# Altium footprint library FxPcbLib.PcbLib: 112 footprints (part 3 of 7)
Each footprint in its own frame and in the unit in brackets; x right, y up, seen from the top. Pads: shape width x height; smd on the part's side, far side on the other; paste and mask are expansions set on the pad; w line width, h text height; cw(c..) or ccw(c..) is an arc to the next point about the centre after c.
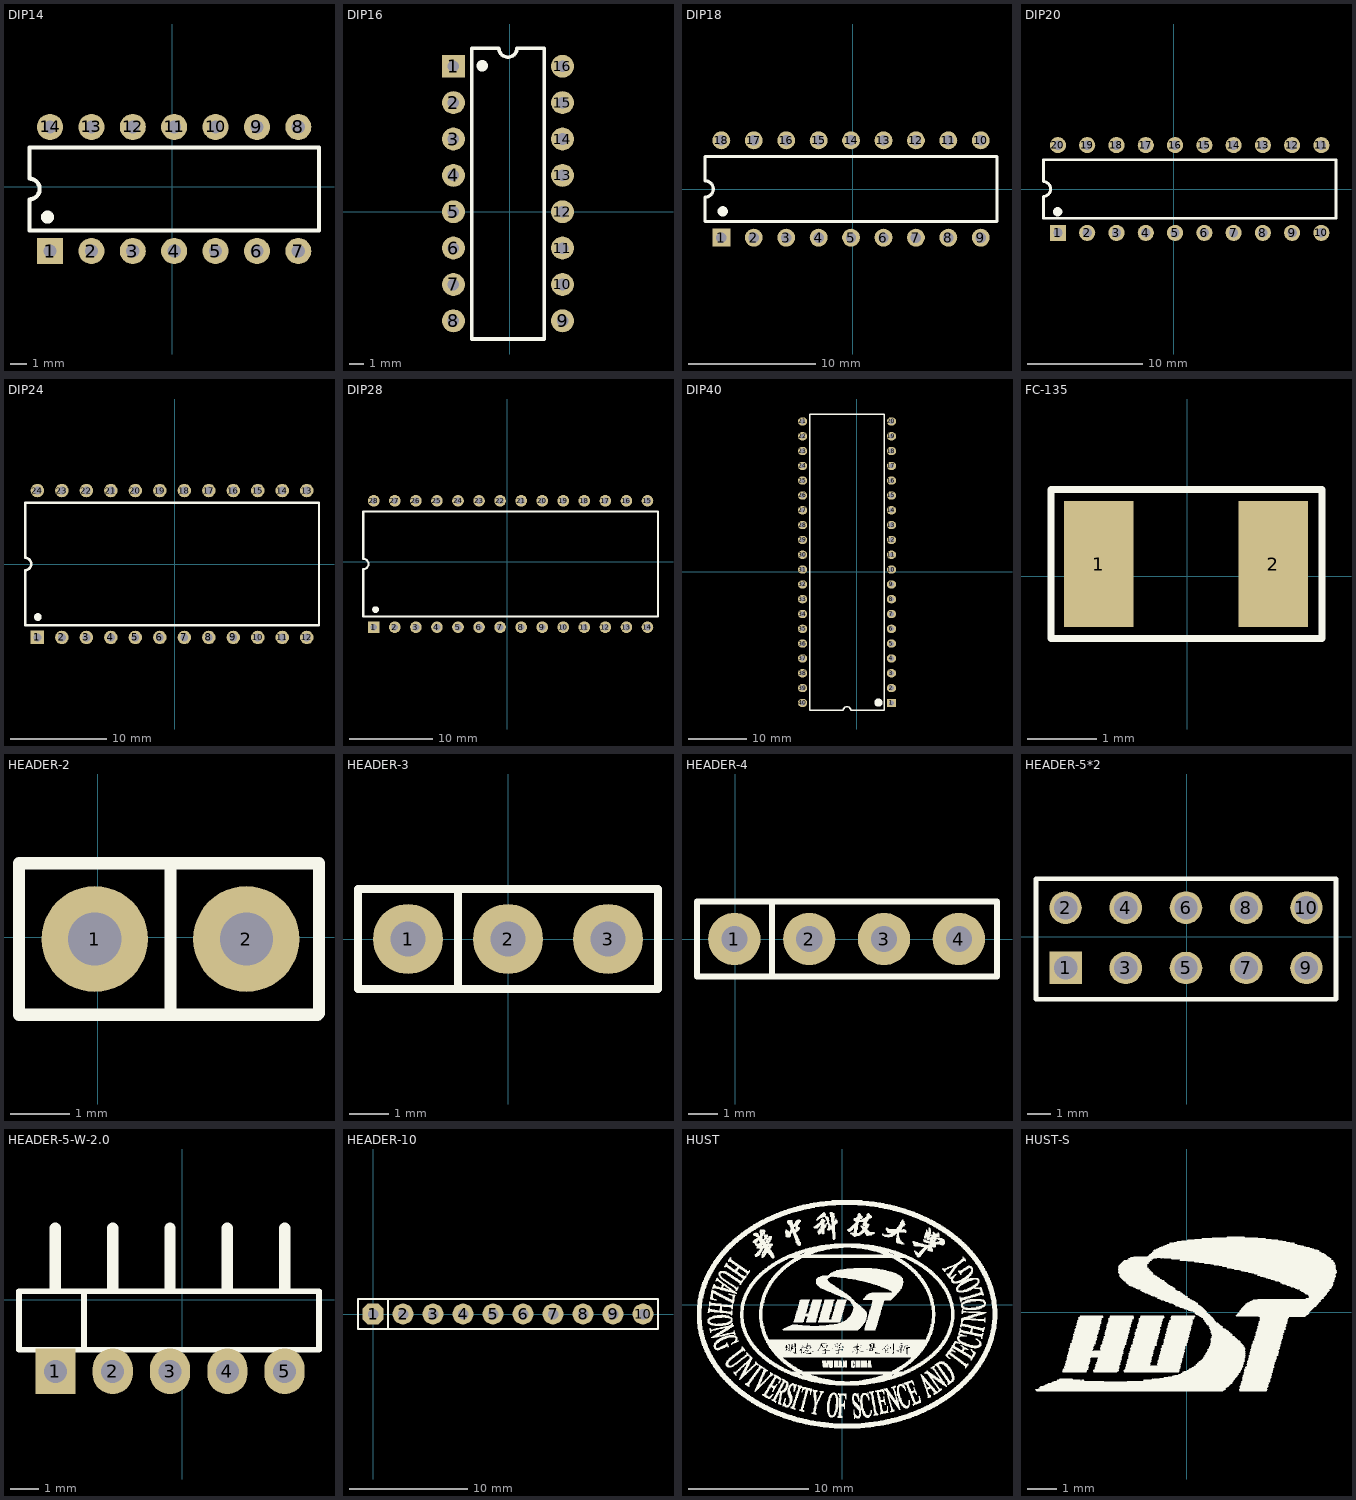
[diagram p2: the footprints below, top view; thin cyan lines are the x and y axes]

## DIP14 [mil]
pads (14):
  rect 62.99x62.99 hole 32: 1(-295,-155)
  round 62.99 hole 32: 2(-195,-155) 3(-95,-155) 4(5,-155) 5(105,-155) 6(205,-155) 7(305,-155) 8(305,145) 9(205,145) 10(105,145) 11(5,145) 12(-95,145) 13(-195,145) 14(-295,145)
Top Overlay:
  circle w19.68: c-301.1,-72.91 r5.91
  lines w10: -345,-105 -345,-30 ccw(c-345,-5) -345,20 -345,95 355,95 355,-105 -345,-105
3D body: height 200.79, standoff -129.92, extent -388.7,-164.84 398.7,145

## DIP16 [mm]
pads (16):
  rect 1.6x1.6 hole 0.813: 1(-3.941,10.16)
  round 1.6 hole 0.813: 2(-3.941,7.62) 3(-3.941,5.08) 4(-3.941,2.54) 5(-3.941,0) 6(-3.941,-2.54) 7(-3.941,-5.08) 8(-3.941,-7.62) 9(3.687,-7.62) 10(3.679,-5.08) 11(3.679,-2.54) 12(3.679,0) 13(3.679,2.54) 14(3.679,5.08) 15(3.679,7.62) 16(3.679,10.16)
Top Overlay:
  circle w0.5: c-1.927,10.195 r0.15
  lines w0.254: -2.671,-8.89 2.409,-8.89 2.409,11.43 0.504,11.43 cw(c-0.131,11.43) -0.766,11.43 -2.671,11.43 -2.671,-8.89
3D body: height 5.1, standoff -3.3, extent -4.06,-8.603 3.81,11.397

## DIP18 [mm]
pads (18):
  rect 1.4x1.4 hole 0.813: 1(-10.287,-3.81)
  round 1.4 hole 0.813: 2(-7.747,-3.81) 3(-5.207,-3.81) 4(-2.667,-3.81) 5(-0.127,-3.81) 6(2.413,-3.81) 7(4.953,-3.81) 8(7.493,-3.81) 9(10.033,-3.81) 10(10.033,3.81) 11(7.493,3.81) 12(4.953,3.81) 13(2.413,3.81) 14(-0.127,3.81) 15(-2.667,3.81) 16(-5.207,3.81) 17(-7.747,3.81) 18(-10.287,3.81)
Top Overlay:
  circle w0.5: c-10.177,-1.75 r0.15
  lines w0.254: -11.557,-2.54 -11.557,-0.635 ccw(c-11.557,0) -11.557,0.635 -11.557,2.54 11.303,2.54 11.303,-2.54 -11.557,-2.54
3D body: height 5.5, standoff -2.5, extent -11.557,-3.937 11.303,3.81

## DIP20 [mm]
pads (20):
  rect 1.4x1.4 hole 0.813: 1(-10.033,-3.81)
  round 1.4 hole 0.813: 2(-7.493,-3.81) 3(-4.953,-3.81) 4(-2.413,-3.81) 5(0.127,-3.81) 6(2.667,-3.81) 7(5.207,-3.81) 8(7.747,-3.81) 9(10.287,-3.81) 10(12.827,-3.81) 11(12.827,3.81) 12(10.287,3.81) 13(7.747,3.81) 14(5.207,3.81) 15(2.667,3.81) 16(0.127,3.81) 17(-2.413,3.81) 18(-4.953,3.81) 19(-7.493,3.81) 20(-10.033,3.81)
Top Overlay:
  circle w0.5: c-10.053,-1.975 r0.15
  lines w0.254: -11.303,-2.54 14.097,-2.54 14.097,2.54 -11.303,2.54 -11.303,0.635 cw(c-11.303,0) -11.303,-0.635 -11.303,-2.54
3D body: height 4.5, standoff -3.5, extent -11.494,-4.05 14.106,3.711

## DIP24 [mm]
pads (24):
  rect 1.4x1.4 hole 0.813: 1(-14.224,-7.62)
  round 1.4 hole 0.813: 2(-11.684,-7.62) 3(-9.144,-7.62) 4(-6.604,-7.62) 5(-4.064,-7.62) 6(-1.524,-7.62) 7(1.016,-7.62) 8(3.556,-7.62) 9(6.096,-7.62) 10(8.636,-7.62) 11(11.176,-7.62) 12(13.716,-7.62) 13(13.716,7.62) 14(11.176,7.62) 15(8.636,7.62) 16(6.096,7.62) 17(3.556,7.62) 18(1.016,7.62) 19(-1.524,7.62) 20(-4.064,7.62) 21(-6.604,7.62) 22(-9.144,7.62) 23(-11.684,7.62) 24(-14.224,7.62)
Top Overlay:
  circle w0.5: c-14.179,-5.5 r0.15
  lines w0.254: -15.494,-6.35 -15.494,-0.635 ccw(c-15.494,0) -15.494,0.635 -15.494,6.35 14.986,6.35 14.986,-6.35 -15.494,-6.35
3D body: height 5.79, standoff -3.3, extent -16.51,-7.491 16.13,7.745

## DIP28 [mil]
pads (28):
  rect 55.12x55.12 hole 32: 1(-635,-310)
  round 55.12 hole 32: 2(-535,-310) 3(-435,-310) 4(-335,-310) 5(-235,-310) 6(-135,-310) 7(-35,-310) 8(65,-310) 9(165,-310) 10(265,-310) 11(365,-310) 12(465,-310) 13(565,-310) 14(665,-310) 15(665,290) 16(565,290) 17(465,290) 18(365,290) 19(265,290) 20(165,290) 21(65,290) 22(-35,290) 23(-135,290) 24(-235,290) 25(-335,290) 26(-435,290) 27(-535,290) 28(-635,290)
Top Overlay:
  circle w19.68: c-626.73,-226.54 r5.91
  lines w10: -685,-260 715,-260 715,240 -685,240 -685,15 cw(c-685,-10) -685,-35 -685,-260
3D body: height 227.95, standoff -129.92, extent -715.08,-314.92 755,284.92

## DIP40 [mil]
pads (40):
  rect 62.99x55.12 hole 32: 1(235,-885)
  oval 62.99x55.12 hole 32: 2(235,-785) 3(235,-685) 4(235,-585) 5(235,-485) 6(235,-385) 7(235,-285) 8(235,-185) 9(235,-85) 10(235,15) 11(235,115) 12(235,215) 13(235,315) 14(235,415) 15(235,515) 16(235,615) 17(235,715) 18(235,815) 19(235,915) 20(235,1015) 21(-365,1015) 22(-365,915) 23(-365,815) 24(-365,715) 25(-365,615) 26(-365,515) 27(-365,415) 28(-365,315) 29(-365,215) 30(-365,115) 31(-365,15) 32(-365,-85) 33(-365,-185) 34(-365,-285) 35(-365,-385) 36(-365,-485) 37(-365,-585) 38(-365,-685) 39(-365,-785) 40(-365,-885)
Top Overlay:
  circle w39.37: c147.6,-882.83 r7.87
  lines w10: -315,-935 -315,1065 185,1065 185,-935 -40,-935 ccw(c-65,-935) -90,-935 -315,-935
3D body: height 227.95, standoff -129.92, extent -365,-975 236.81,1095.87

## FC-135 [mm]
pads (2):
  rect 1x1.8 smd: 1(-1.27,0.178) 2(1.23,0.178)
Top Overlay:
  lines w0.102: -1.956,-0.889 1.93,-0.889 1.93,1.245 -1.956,1.245 -1.956,-0.889
3D body: height 0.8, standoff 0, extent -1.6,-0.572 1.6,0.928

## HEADER-2 [mil]
pads (2):
  round 70 hole 35: 1(-2,-1) 2(98,-1)
Top Overlay:
  lines w7.87: -52,-51 -52,49 ; 48,-51 48,49
  lines w8: -52,-51 145,-51 146,-50 146,49 -52,49
3D body: height 340.16, standoff -118.11, extent -54,-52 146,48

## HEADER-3 [mil]
pads (3):
  round 70 hole 35: 1(-100,0) 2(0,0) 3(100,0)
Top Overlay:
  lines w7.87: -50,-50 -50,50 ; -150,-50 -150,50 150,50 150,-50 -150,-50
3D body: height 330, standoff -150, extent -150,-50 150,50

## HEADER-4 [mil]
pads (4):
  round 70 hole 35: 1(-1,0) 2(99,0) 3(199,0) 4(299,0)
Top Overlay:
  lines w7.87: 49,-50 49,50 ; -51,-50 350,-50 350,50 -51,50 -51,-50
3D body: height 457.76, standoff -113.11, extent -51,-50 349,50

## HEADER-5*2 [mil]
pads (10):
  rect 54x54 / inner round 60 / far side rect 54x54 hole 39: 1(-201,-52)
  round 54 / inner round 60 / far side round 54 hole 39: 2(-201,48) 3(-101,-52) 4(-101,48) 5(-1,-52) 6(-1,48) 7(99,-52) 8(99,48) 9(199,-52) 10(199,48)
Top Overlay:
  lines w8: -250,-104 -250,96 248,96 248,-104 -250,-104
Mechanical 8:
  text "6" at -1,38 h25
  text "7" at 99,-62 h25
  text "8" at 99,38 h25
  text "2" at -201,38 h25
  text "4" at -101,38 h25
  text "5" at -1,-62 h25
  text "3" at -101,-62 h25
  text "9" at 199,-62 h25
  text "1" at -201,-62 h25
3D body: height 314.96, standoff -118.11, extent -250,-104 250,96

## HEADER-5-W-2.0 [mm]
pads (5):
  rect 1.4x1.6 hole 0.8: 1(-4.432,-2.489)
  oval 1.4x1.6 hole 0.8: 2(-2.432,-2.489) 3(-0.432,-2.489) 4(1.568,-2.489) 5(3.568,-2.489)
Top Overlay:
  lines w0.2: -3.432,-1.739 -3.432,0.301 ; 4.768,-1.739 -5.702,-1.739 -5.702,0.301 4.768,0.301 4.768,-1.734
  lines w0.4: -4.432,0.406 -4.432,2.511 ; -2.432,0.406 -2.432,2.511 ; -0.432,0.406 -0.432,2.511 ; 1.568,0.406 1.568,2.511 ; 3.568,0.406 3.568,2.511
Bottom Overlay:
  lines w0.5: -3.432,-3.489 -3.432,-1.489 ; -1.432,-3.489 -1.432,-1.489 ; 0.568,-3.489 0.568,-1.489 ; 2.568,-3.489 2.568,-1.489
3D body: height 2, standoff -2.8, extent -5.385,-2.812 4.565,4.438

## HEADER-10 [mil]
pads (10):
  oct 70x70 hole 35: 1(0,0)
  round 70 hole 35: 2(100,0) 3(200,0) 4(300,0) 5(400,0) 6(500,0) 7(600,0) 8(700,0) 9(800,0) 10(900,0)
Top Overlay:
  lines w8: 50,-50 50,50 ; -50,-50 950,-50 950,50 -50,50 -50,-50
3D body: height 452.76, standoff -118.11, extent -50,-50 950,50

## HUST [mm]
Top Overlay:
  drawing of 9392 lines, arcs and shapes, not listed

## HUST-S [mm]
Top Overlay:
  drawing of 602 lines, arcs and shapes, not listed